# Altium footprint library thu vien thong.PcbLib: 106 footprints (part 1 of 7)
Each footprint in its own frame and in the unit in brackets; x right, y up, seen from the top. Pads: shape width x height; smd on the part's side, far side on the other; paste and mask are expansions set on the pad; w line width, h text height; cw(c..) or ccw(c..) is an arc to the next point about the centre after c.
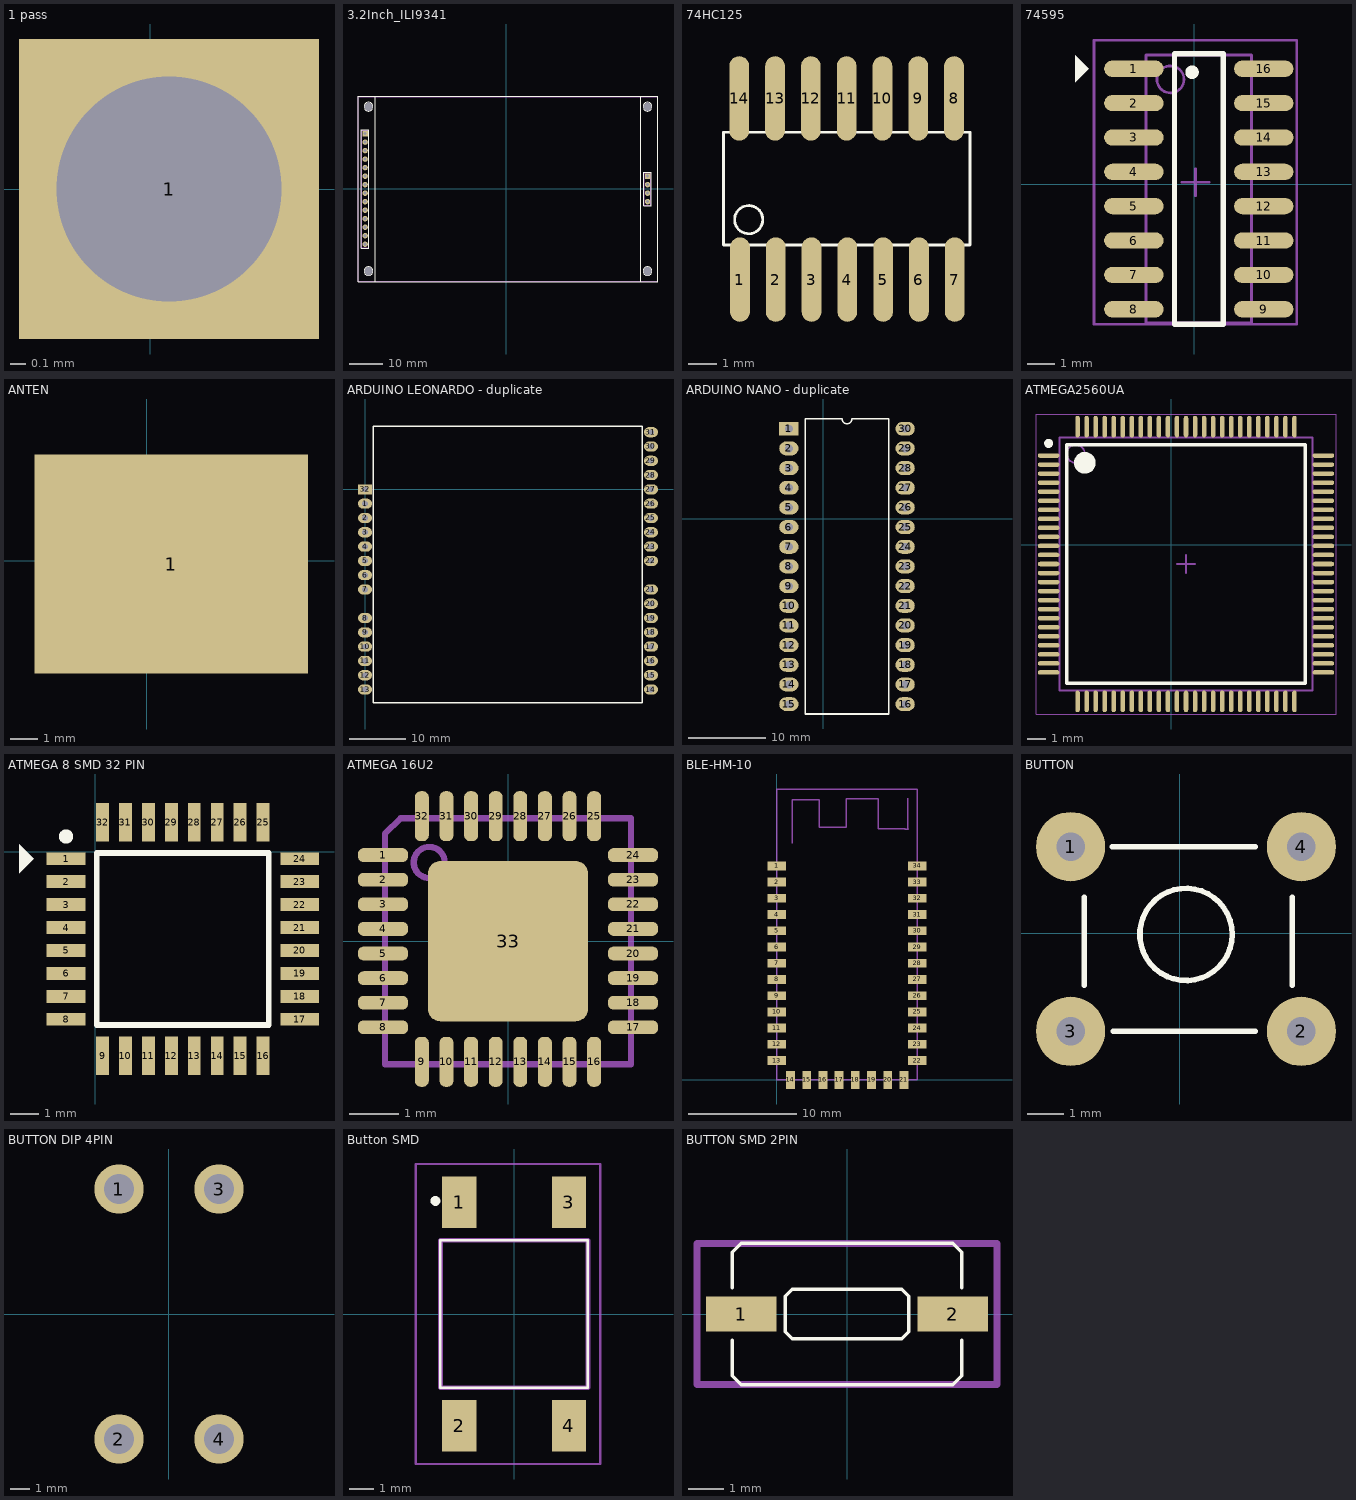
[diagram p0: the footprints below, top view; thin cyan lines are the x and y axes]

## 1 pass [mm]
pads (1):
  rect 2x2 hole 1.5: 1(0.125,0)

## 3.2Inch_ILI9341 [mm]
height 12
pads (22):
  round 0 hole 2.5: 0(-41.151,-24.527) 0(-41.15,24.527) 0(42.131,-24.527) 0(42.131,24.527)
  rect 1.6x1.6 hole 0.92: 1(-42.15,16.5) 15(42.15,3.8)
  round 1.6 hole 0.92: 2(-42.15,13.96) 3(-42.15,11.42) 4(-42.15,8.88) 5(-42.15,6.34) 6(-42.15,3.8) 7(-42.15,1.26) 8(-42.15,-1.28) 9(-42.15,-3.82) 10(-42.15,-6.36) 11(-42.15,-8.9) 12(-42.15,-11.44) 13(-42.15,-13.98) 14(-42.15,-16.52) 16(42.15,1.26) 17(42.15,-1.28) 18(42.15,-3.82)
Top Overlay:
  circle w0.1: c-41.15,24.527 r1.3
  circle w0.1: c-41.15,-24.527 r1.3
  circle w0.1: c42.131,24.527 r1.3
  circle w0.1: c42.131,-24.527 r1.3
  lines w0.1: -44.277,-27.273 -44.277,-27.654 ; -41.261,17.643 -41.007,17.643 -41.007,17.516 -41.007,-17.663 -43.293,-17.663 -43.293,-3.566 -43.293,17.643 -41.134,17.643 ; -39.07,-27.654 -39.07,-27.146 -39.07,27.591 ; 40.051,-27.654 40.051,-26.892 40.051,-27.527 40.051,-6.699 ; 40.051,-6.953 40.051,27.21 40.051,27.591 ; -44.277,-27.654 45.258,-27.654 45.258,27.591 -44.277,27.591 -44.277,-27.654 ; 41.007,-4.963 43.293,-4.963 43.293,4.943 41.007,4.943 41.007,-4.963
Mechanical 1:
  lines w0.05: -44.15,-27.53 -44.15,27.51 45.15,27.51 45.15,-27.53 -44.15,-27.53 ; -43.166,-17.536 -43.166,-14.615 -43.166,17.389 -43.166,17.516 -41.134,17.516 -41.134,17.389 -41.134,-17.536 -43.166,-17.536 ; 41.134,-4.836 43.166,-4.836 43.166,4.816 41.134,4.816 41.134,-4.836
3D body "Part1.STEP": height 4.01, standoff 0.01, extent -44.555,-27.682 45.445,28.318

## 74HC125 [mm]
pads (14):
  oval 0.7x3 smd: 1(1065.479,1165.504) 2(1066.749,1165.504) 3(1068.019,1165.504) 4(1069.289,1165.504) 5(1070.559,1165.504) 6(1071.829,1165.504) 7(1073.099,1165.504) 8(1073.074,1171.931) 9(1071.804,1171.931) 10(1070.534,1171.931) 11(1069.264,1171.931) 12(1067.994,1171.931) 13(1066.724,1171.931) 14(1065.454,1171.931)
Top Layer:
  lines w0.254: 1069.264,1165.53 1069.289,1165.504
Top Overlay:
  circle w0.1: c1065.789,1167.63 r0.5
  lines w0.1: 1064.889,1166.73 1073.639,1166.73 1073.639,1170.73 1064.889,1170.73 1064.889,1166.73
3D body "User Library-SOP14-p127-780.step": height 1.1, standoff 0, extent 1064.184,1165.088 1074.384,1172.388

## 74595 [mm]
pads (16):
  oval 2.2x0.6 smd: 1(-2.222,4.267) 2(-2.222,2.997) 3(-2.222,1.727) 4(-2.222,0.457) 5(-2.222,-0.813) 6(-2.222,-2.083) 7(-2.222,-3.353) 8(-2.222,-4.623) 9(2.578,-4.623) 10(2.578,-3.353) 11(2.578,-2.083) 12(2.578,-0.813) 13(2.578,0.457) 14(2.578,1.727) 15(2.578,2.997) 16(2.578,4.267)
Top Overlay:
  circle w0.25: c-0.074,4.14 r0.125
  region: -4.394,3.759 -3.886,4.267 -4.394,4.775
  lines w0.2: -0.722,-5.178 -0.722,4.822 1.078,4.822 1.078,-5.178 -0.722,-5.178
Mechanical 13:
  circle w0.1: c-0.872,3.872 r0.5
  lines w0.1: -1.772,-5.128 -1.772,4.772 2.128,4.772 2.128,-5.128 -1.772,-5.128
Mechanical 15:
  lines w0.1: -0.449,0.076 0.551,0.076 ; 0.051,-0.424 0.051,0.576 ; -3.699,-5.174 -3.699,5.326 3.801,5.326 3.801,-5.174 -3.699,-5.174

## ANTEN [mm]
pads (1):
  rect 10x8 smd: 1(0.889,-0.127)
Bottom Overlay:
  lines w0.2: -4.674,-4.648 -4.674,-1.346 -4.674,4.343 6.299,4.343 6.299,-4.648 -4.674,-4.648

## ARDUINO LEONARDO - duplicate [mm]
pads (32):
  oval 2.5x1.8 hole 1: 1(0,-2.54) 2(0,-5.08) 3(0,-7.62) 4(0,-10.16) 5(0,-12.7) 6(0,-15.24) 7(0,-17.78) 8(0,-22.86) 9(0,-25.4) 10(0,-27.94) 11(0,-30.48) 12(0,-33.02) 13(0,-35.56) 14(50.8,-35.56) 15(50.8,-33.02) 16(50.8,-30.48) 17(50.8,-27.94) 18(50.8,-25.4) 19(50.8,-22.86) 20(50.8,-20.32) 21(50.8,-17.78) 22(50.8,-12.7) 23(50.8,-10.16) 24(50.8,-7.62) 25(50.8,-5.08) 26(50.8,-2.54) 27(50.8,0) 28(50.8,2.54) 29(50.8,5.08) 30(50.8,7.62) 31(50.8,10.16)
  rect 2.5x1.8 hole 1: 32(0,0)
Top Overlay:
  lines w0.254: 1.45,-37.925 49.25,-37.925 49.25,11.2 1.45,11.2 1.45,-37.925

## ARDUINO NANO - duplicate [mm]
pads (30):
  rect 2.5x1.8 hole 1: 1(-4.425,11.65)
  oval 2.5x1.8 hole 1: 2(-4.425,9.11) 3(-4.425,6.57) 4(-4.425,4.03) 5(-4.425,1.49) 6(-4.425,-1.05) 7(-4.425,-3.59) 8(-4.425,-6.13) 9(-4.425,-8.67) 10(-4.425,-11.21) 11(-4.425,-13.75) 12(-4.425,-16.29) 13(-4.425,-18.83) 14(-4.425,-21.37) 15(-4.425,-23.91) 16(10.575,-23.91) 17(10.575,-21.37) 18(10.575,-18.83) 19(10.575,-16.29) 20(10.575,-13.75) 21(10.575,-11.21) 22(10.575,-8.67) 23(10.575,-6.13) 24(10.575,-3.59) 25(10.575,-1.05) 26(10.575,1.49) 27(10.575,4.03) 28(10.575,6.57) 29(10.575,9.11) 30(10.575,11.65)
Top Overlay:
  lines w0.2: -2.34,-25.18 -2.34,12.92 2.44,12.92 ccw(c3.075,12.92) 3.71,12.92 8.49,12.92 8.49,-25.18 -2.34,-25.18

## ATMEGA2560UA [mm]
pads (100):
  oval 1.2x0.25 smd: 1(-6.791,4.929) 2(-6.791,4.429) 3(-6.791,3.929) 4(-6.791,3.429) 5(-6.791,2.929) 6(-6.791,2.429) 7(-6.791,1.929) 8(-6.791,1.429) 9(-6.791,0.929) 10(-6.791,0.429) 11(-6.791,-0.071) 12(-6.791,-0.571) 13(-6.791,-1.071) 14(-6.791,-1.571) 15(-6.791,-2.071) 16(-6.791,-2.571) 17(-6.791,-3.071) 18(-6.791,-3.571) 19(-6.791,-4.071) 20(-6.791,-4.571) 21(-6.791,-5.071) 22(-6.791,-5.571) 23(-6.791,-6.071) 24(-6.791,-6.571) 25(-6.791,-7.071) 51(8.409,-7.071) 52(8.409,-6.571) 53(8.409,-6.071) 54(8.409,-5.571) 55(8.409,-5.071) 56(8.409,-4.571) 57(8.409,-4.071) 58(8.409,-3.571) 59(8.409,-3.071) 60(8.409,-2.571) 61(8.409,-2.071) 62(8.409,-1.571) 63(8.409,-1.071) 64(8.409,-0.571) 65(8.409,-0.071) 66(8.409,0.429) 67(8.409,0.929) 68(8.409,1.429) 69(8.409,1.929) 70(8.409,2.429) 71(8.409,2.929) 72(8.409,3.429) 73(8.409,3.929) 74(8.409,4.429) 75(8.409,4.929)
  oval 0.25x1.2 smd: 26(-5.191,-8.671) 27(-4.691,-8.671) 28(-4.191,-8.671) 29(-3.691,-8.671) 30(-3.191,-8.671) 31(-2.691,-8.671) 32(-2.191,-8.671) 33(-1.691,-8.671) 34(-1.191,-8.671) 35(-0.691,-8.671) 36(-0.191,-8.671) 37(0.309,-8.671) 38(0.809,-8.671) 39(1.309,-8.671) 40(1.809,-8.671) 41(2.309,-8.671) 42(2.809,-8.671) 43(3.309,-8.671) 44(3.809,-8.671) 45(4.309,-8.671) 46(4.809,-8.671) 47(5.309,-8.671) 48(5.809,-8.671) 49(6.309,-8.671) 50(6.809,-8.671) 76(6.809,6.529) 77(6.309,6.529) 78(5.809,6.529) 79(5.309,6.529) 80(4.809,6.529) 81(4.309,6.529) 82(3.809,6.529) 83(3.309,6.529) 84(2.809,6.529) 85(2.309,6.529) 86(1.809,6.529) 87(1.309,6.529) 88(0.809,6.529) 89(0.309,6.529) 90(-0.191,6.529) 91(-0.691,6.529) 92(-1.191,6.529) 93(-1.691,6.529) 94(-2.191,6.529) 95(-2.691,6.529) 96(-3.191,6.529) 97(-3.691,6.529) 98(-4.191,6.529) 99(-4.691,6.529) 100(-5.191,6.529)
Top Overlay:
  circle w0.6: c-4.791,4.529 r0.3
  circle w0.25: c-6.791,5.604 r0.125
  lines w0.2: -5.791,-7.671 7.409,-7.671 7.409,5.529 -5.791,5.529 -5.791,-7.671
Mechanical 13:
  circle w0.1: c-5.291,5.029 r0.5
  lines w0.1: -6.191,-8.071 7.809,-8.071 7.809,5.929 -6.191,5.929 -6.191,-8.071
Mechanical 15:
  lines w0.05: -7.491,-9.371 9.109,-9.371 9.109,7.229 -7.491,7.229 -7.491,-9.371
  lines w0.1: 0.309,-1.071 1.309,-1.071 ; 0.809,-1.571 0.809,-0.571
3D body "User Library-TQFP100_Grid_0_5.STEP": height 1.2, standoff 0, extent -7.191,-9.071 8.809,6.929

## ATMEGA 8 SMD 32 PIN [mm]
pads (32):
  rect 1.35x0.45 smd: 1(-1.027,-0.248) 2(-1.027,-1.048) 3(-1.027,-1.848) 4(-1.027,-2.648) 5(-1.027,-3.448) 6(-1.027,-4.248) 7(-1.027,-5.048) 8(-1.027,-5.848) 17(7.123,-5.848) 18(7.123,-5.048) 19(7.123,-4.248) 20(7.123,-3.448) 21(7.123,-2.648) 22(7.123,-1.848) 23(7.123,-1.048) 24(7.123,-0.248)
  rect 0.45x1.35 smd: 9(0.248,-7.123) 10(1.048,-7.123) 11(1.848,-7.123) 12(2.648,-7.123) 13(3.448,-7.123) 14(4.248,-7.123) 15(5.048,-7.123) 16(5.848,-7.123) 25(5.848,1.027) 26(5.048,1.027) 27(4.248,1.027) 28(3.448,1.027) 29(2.648,1.027) 30(1.848,1.027) 31(1.048,1.027) 32(0.248,1.027)
Top Overlay:
  circle w0.25: c-1.027,0.527 r0.125
  region: -2.667,0.254 -2.159,-0.254 -2.667,-0.762
  lines w0.2: 0.048,-6.048 0.048,-0.048 6.048,-0.048 6.048,-6.048 0.048,-6.048

## ATMEGA 16U2 [mil] "MLF32"
pads (33):
  rrect80% 40x11.02 smd: 1(-100,68.9) 2(-100,49.21) 3(-100,29.53) 4(-100,9.84) 5(-100,-9.84) 6(-100,-29.53) 7(-100,-49.21) 8(-100,-68.9) 17(100,-68.9) 18(100,-49.21) 19(100,-29.53) 20(100,-9.84) 21(100,9.84) 22(100,29.53) 23(100,49.21) 24(100,68.9)
  rrect80% 11.02x40 smd: 9(-68.9,-96.46) 10(-49.21,-96.46) 11(-29.53,-96.46) 12(-9.84,-96.46) 13(9.84,-96.46) 14(29.53,-96.46) 15(49.21,-96.46) 16(68.9,-96.46) 25(68.9,100) 26(49.21,100) 27(29.53,100) 28(9.84,100) 29(-9.84,100) 30(-29.53,100) 31(-49.21,100) 32(-68.9,100)
  rrect15% 128.11x128.11 smd paste-64.06 mask-64.06: 33(0,0)
Top Paste:
  rectangle: -25,-25 25,25
Top Solder:
  region: 0,50 4.92,50 14.58,48.08 23.68,44.31 31.87,38.84 38.84,31.87 44.31,23.68 48.08,14.58 50,4.92 50,0 50,-4.92 48.08,-14.58 44.31,-23.68 38.84,-31.87 31.87,-38.84 23.68,-44.31 14.58,-48.08 4.92,-50 0,-50 -4.92,-50 -14.58,-48.08 -23.68,-44.31 -31.87,-38.84 -38.84,-31.87 -44.31,-23.68 -48.08,-14.58 -50,-4.92 -50,0 -50,4.92 -48.08,14.58 -44.31,23.68 -38.84,31.87 -31.87,38.84 -23.68,44.31 -14.58,48.08 -4.92,50
Mechanical 2:
  circle w5: c-62.99,62.99 r12.45
  lines w5: -98.43,-98.43 -98.43,85.93 -85.93,98.43 98.43,98.43 98.43,-98.43 -98.43,-98.43
  text "1" at -122.05,78.74 h49.6

## Axial 0.6 [mm]

## BLE-HM-10 [mil] "BLE-HM-10"
pads (34):
  rect 66x32 smd: 1(0,779.13) 2(0,720.08) 3(0,661.02) 4(0,601.97) 5(0,542.91) 6(0,483.86) 7(0,424.8) 8(0,365.75) 9(0,306.69) 10(0,247.64) 11(0,188.58) 12(0,129.53) 13(0,70.47) 22(511.81,70.47) 23(511.81,129.53) 24(511.81,188.58) 25(511.81,247.64) 26(511.81,306.69) 27(511.81,365.75) 28(511.81,424.8) 29(511.81,483.86) 30(511.81,542.91) 31(511.81,601.97) 32(511.81,661.02) 33(511.81,720.08) 34(511.81,779.13)
  rect 32x66 smd: 14(50,0) 15(109.06,0) 16(168.11,0) 17(227.17,0) 18(286.22,0) 19(345.28,0) 20(404.33,0) 21(463.39,0)
Mechanical 2:
  lines w5: 55.96,860.87 55.96,1020.6 155.45,1020.6 155.45,918.96 252.86,918.96 252.86,923.1 ; 252.75,919.53 253.25,919.53 253.25,1022.76 370.04,1022.76 370.04,913.49 467.18,913.49 467.18,911.76 ; 466.44,913.17 478.28,913.17 478.28,914.34 477.59,914.34 477.59,1026.03 ; 0,0 0,1059.06 511.81,1059.06 511.81,0 0,0

## BUTTON [mil]
pads (4):
  round 75 hole 31: 1(-118,94) 2(132,-106) 3(-118,-106) 4(132,94)
Top Overlay:
  circle w6: c7,-1 r50
  lines w6: -103,-56 -103,39 ; -73,94 82,94 ; -72,-106 82,-106 ; 122,-56 122,39
  lines w7: 121,-121 122,-120
3D body "SW3dPS-.STEP": height 275.59, standoff -137.8, extent -153.51,-126 157.51,118.09

## BUTTON DIP 4PIN [mm]
pads (4):
  round 2.5 hole 1.5: 1(-2.538,6.362) 2(-2.538,-6.338) 3(2.542,6.362) 4(2.542,-6.338)
Bottom Overlay:
  circle w0.254: c0.002,0.012 r3.81
  lines w0.229: -6.348,-7.608 -6.348,7.632 6.352,7.632 6.352,-7.608 -6.348,-7.608

## Button SMD [mm]
pads (4):
  rect 1.4x2.1 smd: 1(-2.23,4.55) 2(-2.23,-4.55) 3(2.23,4.55) 4(2.23,-4.55)
Top Overlay:
  lines w0.1: -3,-3 3,-3 3,3 -3,3 -3,-3
  lines w0.2: -3.2,4.5 ccw(c-3.2,4.6) -3.2,4.7 ccw(c-3.2,4.6) -3.2,4.5
Mechanical 13:
  lines w0.2: -3,-3 3,-3 3,3 -3,3 -3,-3
Mechanical 15:
  lines w0.1: -4,-6.1 3.5,-6.1 3.5,6.1 -4,6.1 -4,-6.1
3D body "3-1437565-0.stp": height 4.38, standoff 0, extent -3,-5 3,5

## BUTTON SMD 2PIN [mil] "3,5 mm Tact Switches, PTS635 Series"
pads (2):
  rect 79x39 smd: 1(-118,0) 2(118,0)
Top Overlay:
  lines w3.94: -127.95,-29.53 -127.95,-68.9 -118.11,-78.74 118.11,-78.74 127.95,-68.9 127.95,-29.53 ; -127.95,29.53 -127.95,68.9 -118.11,78.74 118.11,78.74 127.95,68.9 127.95,29.53 ; -68.9,-19.68 -61.02,-27.56 61.02,-27.56 68.9,-19.68 68.9,-9.84 68.9,19.68 61.02,27.56 -61.02,27.56 -68.9,19.68 -68.9,-19.68
Mechanical 13:
  lines w7.87: -167.32,-78.74 -167.32,78.74 167.32,78.74 167.32,-78.74 -167.32,-78.74
3D body: height 30, standoff 0, extent 120,-12.5 135,12.5
3D body: height 30, standoff 0, extent -135,-12.5 -120,12.5
3D body: height 55, standoff 0, extent -120,-70 120,70
3D body: height 80, standoff 55, extent -95,-50 100,50
3D body: height 100, standoff 80, extent -65,-22.36 65,22.64